# Altium footprint library Connector_PinHeader_2.54mm.PcbLib: 278 footprints (part 5 of 18) (continued)
## PinHeader_1x19_P2.54mm_Horizontal [mm] (continued)
  text "'.Designator'" at 3.61,-26.907 h1

## PinHeader_1x19_P2.54mm_Vertical [mm]
pads (19):
  rect 1.7x1.7 hole 1: 1(0,0)
  rrect100% 1.7x1.7 hole 1: 2(0,-2.54) 3(0,-5.08) 4(0,-7.62) 5(0,-10.16) 6(0,-12.7) 7(0,-15.24) 8(0,-17.78) 9(0,-20.32) 10(0,-22.86) 11(0,-25.4) 12(0,-27.94) 13(0,-30.48) 14(0,-33.02) 15(0,-35.56) 16(0,-38.1) 17(0,-40.64) 18(0,-43.18) 19(0,-45.72)
F.SilkS:
  lines w0.12: -1.33,0 -1.33,1.33 0,1.33 ; -1.33,-47.05 -1.33,-1.27 1.33,-1.27 1.33,-47.05 -1.33,-47.05
F.CrtYd:
  lines w0.05: -1.8,-47.5 1.8,-47.5 1.8,1.8 -1.8,1.8 -1.8,-47.5
F.Fab:
  lines w0.1: -1.27,-46.99 1.27,-46.99 1.27,1.27 -0.635,1.27 -1.27,0.635 -1.27,-46.99
  text "'.Designator'" at 0.84,-26.907 h1

## PinHeader_1x19_P2.54mm_Vertical_SMD_Pin1Left [mm]
pads (19):
  rect 2.51x1 smd: 1(-1.655,22.86) 2(1.655,20.32) 3(-1.655,17.78) 4(1.655,15.24) 5(-1.655,12.7) 6(1.655,10.16) 7(-1.655,7.62) 8(1.655,5.08) 9(-1.655,2.54) 10(1.655,0) 11(-1.655,-2.54) 12(1.655,-5.08) 13(-1.655,-7.62) 14(1.655,-10.16) 15(-1.655,-12.7) 16(1.655,-15.24) 17(-1.655,-17.78) 18(1.655,-20.32) 19(-1.655,-22.86)
F.SilkS:
  lines w0.12: -2.85,23.62 -1.33,23.62 -1.33,24.19 1.33,24.19 1.33,21.08 ; -1.33,-24.19 1.33,-24.19 ; -1.33,-22.1 -1.33,-18.54 ; -1.33,-17.02 -1.33,-13.46 ; -1.33,-11.94 -1.33,-8.38 ; -1.33,-6.86 -1.33,-3.3 ; -1.33,-1.78 -1.33,1.78 ; -1.33,3.3 -1.33,6.86 ; -1.33,8.38 -1.33,11.94 ; -1.33,13.46 -1.33,17.02 ; -1.33,18.54 -1.33,22.1 ; 1.33,-23.62 1.33,-24.19 ; 1.33,-21.08 1.33,-24.19 ; 1.33,-19.56 1.33,-16 ; 1.33,-14.48 1.33,-10.92 ; 1.33,-9.4 1.33,-5.84 ; 1.33,-4.32 1.33,-0.76 ; 1.33,0.76 1.33,4.32 ; 1.33,5.84 1.33,9.4 ; 1.33,10.92 1.33,14.48 ; 1.33,16 1.33,19.56
F.CrtYd:
  lines w0.05: -3.45,-24.65 -3.45,24.65 3.45,24.65 3.45,-24.65 -3.45,-24.65
F.Fab:
  lines w0.1: -1.27,-23.18 -2.54,-23.18 -2.54,-22.54 -1.27,-22.54 ; -1.27,-18.1 -2.54,-18.1 -2.54,-17.46 -1.27,-17.46 ; -1.27,-13.02 -2.54,-13.02 -2.54,-12.38 -1.27,-12.38 ; -1.27,-7.94 -2.54,-7.94 -2.54,-7.3 -1.27,-7.3 ; -1.27,-2.86 -2.54,-2.86 -2.54,-2.22 -1.27,-2.22 ; -1.27,2.22 -2.54,2.22 -2.54,2.86 -1.27,2.86 ; -1.27,7.3 -2.54,7.3 -2.54,7.94 -1.27,7.94 ; -1.27,12.38 -2.54,12.38 -2.54,13.02 -1.27,13.02 ; -1.27,17.46 -2.54,17.46 -2.54,18.1 -1.27,18.1 ; -1.27,22.54 -2.54,22.54 -2.54,23.18 -1.27,23.18 ; 1.27,-20.64 2.54,-20.64 2.54,-20 1.27,-20 ; 1.27,-15.56 2.54,-15.56 2.54,-14.92 1.27,-14.92 ; 1.27,-10.48 2.54,-10.48 2.54,-9.84 1.27,-9.84 ; 1.27,-5.4 2.54,-5.4 2.54,-4.76 1.27,-4.76 ; 1.27,-0.32 2.54,-0.32 2.54,0.32 1.27,0.32 ; 1.27,4.76 2.54,4.76 2.54,5.4 1.27,5.4 ; 1.27,9.84 2.54,9.84 2.54,10.48 1.27,10.48 ; 1.27,14.92 2.54,14.92 2.54,15.56 1.27,15.56 ; 1.27,20 2.54,20 2.54,20.64 1.27,20.64 ; -1.27,23.18 -0.32,24.13 1.27,24.13 1.27,-24.13 -1.27,-24.13 -1.27,23.18
  text "'.Designator'" at 0.84,-4.047 h1

## PinHeader_1x19_P2.54mm_Vertical_SMD_Pin1Right [mm]
pads (19):
  rect 2.51x1 smd: 1(1.655,22.86) 2(-1.655,20.32) 3(1.655,17.78) 4(-1.655,15.24) 5(1.655,12.7) 6(-1.655,10.16) 7(1.655,7.62) 8(-1.655,5.08) 9(1.655,2.54) 10(-1.655,0) 11(1.655,-2.54) 12(-1.655,-5.08) 13(1.655,-7.62) 14(-1.655,-10.16) 15(1.655,-12.7) 16(-1.655,-15.24) 17(1.655,-17.78) 18(-1.655,-20.32) 19(1.655,-22.86)
F.SilkS:
  lines w0.12: -1.33,-23.62 -1.33,-24.19 ; -1.33,-21.08 -1.33,-24.19 ; -1.33,-19.56 -1.33,-16 ; -1.33,-14.48 -1.33,-10.92 ; -1.33,-9.4 -1.33,-5.84 ; -1.33,-4.32 -1.33,-0.76 ; -1.33,0.76 -1.33,4.32 ; -1.33,5.84 -1.33,9.4 ; -1.33,10.92 -1.33,14.48 ; -1.33,16 -1.33,19.56 ; -1.33,21.08 -1.33,24.19 1.33,24.19 1.33,23.62 2.85,23.62 ; 1.33,-24.19 -1.33,-24.19 ; 1.33,-22.1 1.33,-18.54 ; 1.33,-17.02 1.33,-13.46 ; 1.33,-11.94 1.33,-8.38 ; 1.33,-6.86 1.33,-3.3 ; 1.33,-1.78 1.33,1.78 ; 1.33,3.3 1.33,6.86 ; 1.33,8.38 1.33,11.94 ; 1.33,13.46 1.33,17.02 ; 1.33,18.54 1.33,22.1
F.CrtYd:
  lines w0.05: -3.45,-24.65 3.45,-24.65 3.45,24.65 -3.45,24.65 -3.45,-24.65
F.Fab:
  lines w0.1: -1.27,-20.64 -2.54,-20.64 -2.54,-20 -1.27,-20 ; -1.27,-15.56 -2.54,-15.56 -2.54,-14.92 -1.27,-14.92 ; -1.27,-10.48 -2.54,-10.48 -2.54,-9.84 -1.27,-9.84 ; -1.27,-5.4 -2.54,-5.4 -2.54,-4.76 -1.27,-4.76 ; -1.27,-0.32 -2.54,-0.32 -2.54,0.32 -1.27,0.32 ; -1.27,4.76 -2.54,4.76 -2.54,5.4 -1.27,5.4 ; -1.27,9.84 -2.54,9.84 -2.54,10.48 -1.27,10.48 ; -1.27,14.92 -2.54,14.92 -2.54,15.56 -1.27,15.56 ; -1.27,20 -2.54,20 -2.54,20.64 -1.27,20.64 ; 1.27,-23.18 2.54,-23.18 2.54,-22.54 1.27,-22.54 ; 1.27,-18.1 2.54,-18.1 2.54,-17.46 1.27,-17.46 ; 1.27,-13.02 2.54,-13.02 2.54,-12.38 1.27,-12.38 ; 1.27,-7.94 2.54,-7.94 2.54,-7.3 1.27,-7.3 ; 1.27,-2.86 2.54,-2.86 2.54,-2.22 1.27,-2.22 ; 1.27,2.22 2.54,2.22 2.54,2.86 1.27,2.86 ; 1.27,7.3 2.54,7.3 2.54,7.94 1.27,7.94 ; 1.27,12.38 2.54,12.38 2.54,13.02 1.27,13.02 ; 1.27,17.46 2.54,17.46 2.54,18.1 1.27,18.1 ; 1.27,22.54 2.54,22.54 2.54,23.18 1.27,23.18 ; 1.27,23.18 0.32,24.13 -1.27,24.13 -1.27,-24.13 1.27,-24.13 1.27,23.18
  text "'.Designator'" at 0.84,-4.047 h1

## PinHeader_1x20_P2.54mm_Horizontal [mm]
pads (20):
  rect 1.7x1.7 hole 1: 1(0,0)
  rrect100% 1.7x1.7 hole 1: 2(0,-2.54) 3(0,-5.08) 4(0,-7.62) 5(0,-10.16) 6(0,-12.7) 7(0,-15.24) 8(0,-17.78) 9(0,-20.32) 10(0,-22.86) 11(0,-25.4) 12(0,-27.94) 13(0,-30.48) 14(0,-33.02) 15(0,-35.56) 16(0,-38.1) 17(0,-40.64) 18(0,-43.18) 19(0,-45.72) 20(0,-48.26)
F.SilkS:
  lines w0.12: -1.27,0 -1.27,1.27 0,1.27 ; 1.043,-48.64 1.44,-48.64 ; 1.043,-47.88 1.44,-47.88 ; 1.043,-46.1 1.44,-46.1 ; 1.043,-45.34 1.44,-45.34 ; 1.043,-43.56 1.44,-43.56 ; 1.043,-42.8 1.44,-42.8 ; 1.043,-41.02 1.44,-41.02 ; 1.043,-40.26 1.44,-40.26 ; 1.043,-38.48 1.44,-38.48 ; 1.043,-37.72 1.44,-37.72 ; 1.043,-35.94 1.44,-35.94 ; 1.043,-35.18 1.44,-35.18 ; 1.043,-33.4 1.44,-33.4 ; 1.043,-32.64 1.44,-32.64 ; 1.043,-30.86 1.44,-30.86 ; 1.043,-30.1 1.44,-30.1 ; 1.043,-28.32 1.44,-28.32 ; 1.043,-27.56 1.44,-27.56 ; 1.043,-25.78 1.44,-25.78 ; 1.043,-25.02 1.44,-25.02 ; 1.043,-23.24 1.44,-23.24 ; 1.043,-22.48 1.44,-22.48 ; 1.043,-20.7 1.44,-20.7 ; 1.043,-19.94 1.44,-19.94 ; 1.043,-18.16 1.44,-18.16 ; 1.043,-17.4 1.44,-17.4 ; 1.043,-15.62 1.44,-15.62 ; 1.043,-14.86 1.44,-14.86 ; 1.043,-13.08 1.44,-13.08 ; 1.043,-12.32 1.44,-12.32 ; 1.043,-10.54 1.44,-10.54 ; 1.043,-9.78 1.44,-9.78 ; 1.043,-8 1.44,-8 ; 1.043,-7.24 1.44,-7.24 ; 1.043,-5.46 1.44,-5.46 ; 1.043,-4.7 1.44,-4.7 ; 1.043,-2.92 1.44,-2.92 ; 1.043,-2.16 1.44,-2.16 ; 1.11,-0.38 1.44,-0.38 ; 1.11,0.38 1.44,0.38 ; 1.44,-46.99 4.1,-46.99 ; 1.44,-44.45 4.1,-44.45 ; 1.44,-41.91 4.1,-41.91 ; 1.44,-39.37 4.1,-39.37 ; 1.44,-36.83 4.1,-36.83 ; 1.44,-34.29 4.1,-34.29 ; 1.44,-31.75 4.1,-31.75 ; 1.44,-29.21 4.1,-29.21 ; 1.44,-26.67 4.1,-26.67 ; 1.44,-24.13 4.1,-24.13 ; 1.44,-21.59 4.1,-21.59 ; 1.44,-19.05 4.1,-19.05 ; 1.44,-16.51 4.1,-16.51 ; 1.44,-13.97 4.1,-13.97 ; 1.44,-11.43 4.1,-11.43 ; 1.44,-8.89 4.1,-8.89 ; 1.44,-6.35 4.1,-6.35 ; 1.44,-3.81 4.1,-3.81 ; 1.44,-1.27 4.1,-1.27 ; 4.1,-48.64 10.1,-48.64 10.1,-47.88 4.1,-47.88 ; 4.1,-46.1 10.1,-46.1 10.1,-45.34 4.1,-45.34 ; 4.1,-43.56 10.1,-43.56 10.1,-42.8 4.1,-42.8 ; 4.1,-41.02 10.1,-41.02 10.1,-40.26 4.1,-40.26 ; 4.1,-38.48 10.1,-38.48 10.1,-37.72 4.1,-37.72 ; 4.1,-35.94 10.1,-35.94 10.1,-35.18 4.1,-35.18 ; 4.1,-33.4 10.1,-33.4 10.1,-32.64 4.1,-32.64 ; 4.1,-30.86 10.1,-30.86 10.1,-30.1 4.1,-30.1 ; 4.1,-28.32 10.1,-28.32 10.1,-27.56 4.1,-27.56 ; 4.1,-25.78 10.1,-25.78 10.1,-25.02 4.1,-25.02 ; 4.1,-23.24 10.1,-23.24 10.1,-22.48 4.1,-22.48 ; 4.1,-20.7 10.1,-20.7 10.1,-19.94 4.1,-19.94 ; 4.1,-18.16 10.1,-18.16 10.1,-17.4 4.1,-17.4 ; 4.1,-15.62 10.1,-15.62 10.1,-14.86 4.1,-14.86 ; 4.1,-13.08 10.1,-13.08 10.1,-12.32 4.1,-12.32 ; 4.1,-10.54 10.1,-10.54 10.1,-9.78 4.1,-9.78 ; 4.1,-8 10.1,-8 10.1,-7.24 4.1,-7.24 ; 4.1,-5.46 10.1,-5.46 10.1,-4.7 4.1,-4.7 ; 4.1,-2.92 10.1,-2.92 10.1,-2.16 4.1,-2.16 ; 4.1,-0.38 10.1,-0.38 10.1,0.38 4.1,0.38 ; 4.1,-0.28 10.1,-0.28 ; 4.1,-0.16 10.1,-0.16 ; 4.1,-0.04 10.1,-0.04 ; 4.1,0.08 10.1,0.08 ; 4.1,0.2 10.1,0.2 ; 4.1,0.32 10.1,0.32 ; 1.44,-49.59 4.1,-49.59 4.1,1.33 1.44,1.33 1.44,-49.59
F.CrtYd:
  lines w0.05: -1.8,-50.05 10.55,-50.05 10.55,1.8 -1.8,1.8 -1.8,-50.05
F.Fab:
  lines w0.1: 1.5,-48.58 -0.32,-48.58 -0.32,-47.94 1.5,-47.94 ; 1.5,-46.04 -0.32,-46.04 -0.32,-45.4 1.5,-45.4 ; 1.5,-43.5 -0.32,-43.5 -0.32,-42.86 1.5,-42.86 ; 1.5,-40.96 -0.32,-40.96 -0.32,-40.32 1.5,-40.32 ; 1.5,-38.42 -0.32,-38.42 -0.32,-37.78 1.5,-37.78 ; 1.5,-35.88 -0.32,-35.88 -0.32,-35.24 1.5,-35.24 ; 1.5,-33.34 -0.32,-33.34 -0.32,-32.7 1.5,-32.7 ; 1.5,-30.8 -0.32,-30.8 -0.32,-30.16 1.5,-30.16 ; 1.5,-28.26 -0.32,-28.26 -0.32,-27.62 1.5,-27.62 ; 1.5,-25.72 -0.32,-25.72 -0.32,-25.08 1.5,-25.08 ; 1.5,-23.18 -0.32,-23.18 -0.32,-22.54 1.5,-22.54 ; 1.5,-20.64 -0.32,-20.64 -0.32,-20 1.5,-20 ; 1.5,-18.1 -0.32,-18.1 -0.32,-17.46 1.5,-17.46 ; 1.5,-15.56 -0.32,-15.56 -0.32,-14.92 1.5,-14.92 ; 1.5,-13.02 -0.32,-13.02 -0.32,-12.38 1.5,-12.38 ; 1.5,-10.48 -0.32,-10.48 -0.32,-9.84 1.5,-9.84 ; 1.5,-7.94 -0.32,-7.94 -0.32,-7.3 1.5,-7.3 ; 1.5,-5.4 -0.32,-5.4 -0.32,-4.76 1.5,-4.76 ; 1.5,-2.86 -0.32,-2.86 -0.32,-2.22 1.5,-2.22 ; 1.5,-0.32 -0.32,-0.32 -0.32,0.32 1.5,0.32 ; 4.04,-48.58 10.04,-48.58 10.04,-47.94 4.04,-47.94 ; 4.04,-46.04 10.04,-46.04 10.04,-45.4 4.04,-45.4 ; 4.04,-43.5 10.04,-43.5 10.04,-42.86 4.04,-42.86 ; 4.04,-40.96 10.04,-40.96 10.04,-40.32 4.04,-40.32 ; 4.04,-38.42 10.04,-38.42 10.04,-37.78 4.04,-37.78 ; 4.04,-35.88 10.04,-35.88 10.04,-35.24 4.04,-35.24 ; 4.04,-33.34 10.04,-33.34 10.04,-32.7 4.04,-32.7 ; 4.04,-30.8 10.04,-30.8 10.04,-30.16 4.04,-30.16 ; 4.04,-28.26 10.04,-28.26 10.04,-27.62 4.04,-27.62 ; 4.04,-25.72 10.04,-25.72 10.04,-25.08 4.04,-25.08 ; 4.04,-23.18 10.04,-23.18 10.04,-22.54 4.04,-22.54 ; 4.04,-20.64 10.04,-20.64 10.04,-20 4.04,-20 ; 4.04,-18.1 10.04,-18.1 10.04,-17.46 4.04,-17.46 ; 4.04,-15.56 10.04,-15.56 10.04,-14.92 4.04,-14.92 ; 4.04,-13.02 10.04,-13.02 10.04,-12.38 4.04,-12.38 ; 4.04,-10.48 10.04,-10.48 10.04,-9.84 4.04,-9.84 ; 4.04,-7.94 10.04,-7.94 10.04,-7.3 4.04,-7.3 ; 4.04,-5.4 10.04,-5.4 10.04,-4.76 4.04,-4.76 ; 4.04,-2.86 10.04,-2.86 10.04,-2.22 4.04,-2.22 ; 4.04,-0.32 10.04,-0.32 10.04,0.32 4.04,0.32 ; 1.5,-49.53 4.04,-49.53 4.04,1.27 2.135,1.27 1.5,0.635 1.5,-49.53
  text "'.Designator'" at 3.61,-28.177 h1

## PinHeader_1x20_P2.54mm_Vertical [mm]
pads (20):
  rect 1.7x1.7 hole 1: 1(0,0)
  rrect100% 1.7x1.7 hole 1: 2(0,-2.54) 3(0,-5.08) 4(0,-7.62) 5(0,-10.16) 6(0,-12.7) 7(0,-15.24) 8(0,-17.78) 9(0,-20.32) 10(0,-22.86) 11(0,-25.4) 12(0,-27.94) 13(0,-30.48) 14(0,-33.02) 15(0,-35.56) 16(0,-38.1) 17(0,-40.64) 18(0,-43.18) 19(0,-45.72) 20(0,-48.26)
F.SilkS:
  lines w0.12: -1.33,0 -1.33,1.33 0,1.33 ; -1.33,-49.59 1.33,-49.59 1.33,-1.27 -1.33,-1.27 -1.33,-49.59
F.CrtYd:
  lines w0.05: -1.8,-50.05 1.8,-50.05 1.8,1.8 -1.8,1.8 -1.8,-50.05
F.Fab:
  lines w0.1: -1.27,-49.53 -1.27,0.635 -0.635,1.27 1.27,1.27 1.27,-49.53 -1.27,-49.53
  text "'.Designator'" at 0.84,-28.177 h1

## PinHeader_1x20_P2.54mm_Vertical_SMD_Pin1Left [mm]
pads (20):
  rect 2.51x1 smd: 1(-1.655,24.13) 2(1.655,21.59) 3(-1.655,19.05) 4(1.655,16.51) 5(-1.655,13.97) 6(1.655,11.43) 7(-1.655,8.89) 8(1.655,6.35) 9(-1.655,3.81) 10(1.655,1.27) 11(-1.655,-1.27) 12(1.655,-3.81) 13(-1.655,-6.35) 14(1.655,-8.89) 15(-1.655,-11.43) 16(1.655,-13.97) 17(-1.655,-16.51) 18(1.655,-19.05) 19(-1.655,-21.59) 20(1.655,-24.13)
F.SilkS:
  lines w0.12: -2.85,24.89 -1.33,24.89 -1.33,25.46 1.33,25.46 1.33,22.35 ; -1.33,-22.35 -1.33,-25.46 1.33,-25.46 1.33,-24.89 ; -1.33,-20.83 -1.33,-17.27 ; -1.33,-15.75 -1.33,-12.19 ; -1.33,-10.67 -1.33,-7.11 ; -1.33,-5.59 -1.33,-2.03 ; -1.33,-0.51 -1.33,3.05 ; -1.33,4.57 -1.33,8.13 ; -1.33,9.65 -1.33,13.21 ; -1.33,14.73 -1.33,18.29 ; -1.33,19.81 -1.33,23.37 ; 1.33,-23.37 1.33,-19.81 ; 1.33,-18.29 1.33,-14.73 ; 1.33,-13.21 1.33,-9.65 ; 1.33,-8.13 1.33,-4.57 ; 1.33,-3.05 1.33,0.51 ; 1.33,2.03 1.33,5.59 ; 1.33,7.11 1.33,10.67 ; 1.33,12.19 1.33,15.75 ; 1.33,17.27 1.33,20.83
F.CrtYd:
  lines w0.05: -3.45,-25.9 3.45,-25.9 3.45,25.9 -3.45,25.9 -3.45,-25.9
F.Fab:
  lines w0.1: -1.27,-21.91 -2.54,-21.91 -2.54,-21.27 -1.27,-21.27 ; -1.27,-16.83 -2.54,-16.83 -2.54,-16.19 -1.27,-16.19 ; -1.27,-11.75 -2.54,-11.75 -2.54,-11.11 -1.27,-11.11 ; -1.27,-6.67 -2.54,-6.67 -2.54,-6.03 -1.27,-6.03 ; -1.27,-1.59 -2.54,-1.59 -2.54,-0.95 -1.27,-0.95 ; -1.27,3.49 -2.54,3.49 -2.54,4.13 -1.27,4.13 ; -1.27,8.57 -2.54,8.57 -2.54,9.21 -1.27,9.21 ; -1.27,13.65 -2.54,13.65 -2.54,14.29 -1.27,14.29 ; -1.27,18.73 -2.54,18.73 -2.54,19.37 -1.27,19.37 ; -1.27,23.81 -2.54,23.81 -2.54,24.45 -1.27,24.45 ; 1.27,-24.45 2.54,-24.45 2.54,-23.81 1.27,-23.81 ; 1.27,-19.37 2.54,-19.37 2.54,-18.73 1.27,-18.73 ; 1.27,-14.29 2.54,-14.29 2.54,-13.65 1.27,-13.65 ; 1.27,-9.21 2.54,-9.21 2.54,-8.57 1.27,-8.57 ; 1.27,-4.13 2.54,-4.13 2.54,-3.49 1.27,-3.49 ; 1.27,0.95 2.54,0.95 2.54,1.59 1.27,1.59 ; 1.27,6.03 2.54,6.03 2.54,6.67 1.27,6.67 ; 1.27,11.11 2.54,11.11 2.54,11.75 1.27,11.75 ; 1.27,16.19 2.54,16.19 2.54,16.83 1.27,16.83 ; 1.27,21.27 2.54,21.27 2.54,21.91 1.27,21.91 ; -1.27,24.45 -0.32,25.4 1.27,25.4 1.27,-25.4 -1.27,-25.4 -1.27,24.45
  text "'.Designator'" at 0.84,-4.047 h1

## PinHeader_1x20_P2.54mm_Vertical_SMD_Pin1Right [mm]
pads (20):
  rect 2.51x1 smd: 1(1.655,24.13) 2(-1.655,21.59) 3(1.655,19.05) 4(-1.655,16.51) 5(1.655,13.97) 6(-1.655,11.43) 7(1.655,8.89) 8(-1.655,6.35) 9(1.655,3.81) 10(-1.655,1.27) 11(1.655,-1.27) 12(-1.655,-3.81) 13(1.655,-6.35) 14(-1.655,-8.89) 15(1.655,-11.43) 16(-1.655,-13.97) 17(1.655,-16.51) 18(-1.655,-19.05) 19(1.655,-21.59) 20(-1.655,-24.13)
F.SilkS:
  lines w0.12: -1.33,-24.89 -1.33,-25.46 1.33,-25.46 1.33,-22.35 ; -1.33,-23.37 -1.33,-19.81 ; -1.33,-18.29 -1.33,-14.73 ; -1.33,-13.21 -1.33,-9.65 ; -1.33,-8.13 -1.33,-4.57 ; -1.33,-3.05 -1.33,0.51 ; -1.33,2.03 -1.33,5.59 ; -1.33,7.11 -1.33,10.67 ; -1.33,12.19 -1.33,15.75 ; -1.33,17.27 -1.33,20.83 ; -1.33,22.35 -1.33,25.46 1.33,25.46 1.33,24.89 2.85,24.89 ; 1.33,-20.83 1.33,-17.27 ; 1.33,-15.75 1.33,-12.19 ; 1.33,-10.67 1.33,-7.11 ; 1.33,-5.59 1.33,-2.03 ; 1.33,-0.51 1.33,3.05 ; 1.33,4.57 1.33,8.13 ; 1.33,9.65 1.33,13.21 ; 1.33,14.73 1.33,18.29 ; 1.33,19.81 1.33,23.37
F.CrtYd:
  lines w0.05: -3.45,-25.9 3.45,-25.9 3.45,25.9 -3.45,25.9 -3.45,-25.9
F.Fab:
  lines w0.1: -1.27,-24.45 -2.54,-24.45 -2.54,-23.81 -1.27,-23.81 ; -1.27,-19.37 -2.54,-19.37 -2.54,-18.73 -1.27,-18.73 ; -1.27,-14.29 -2.54,-14.29 -2.54,-13.65 -1.27,-13.65 ; -1.27,-9.21 -2.54,-9.21 -2.54,-8.57 -1.27,-8.57 ; -1.27,-4.13 -2.54,-4.13 -2.54,-3.49 -1.27,-3.49 ; -1.27,0.95 -2.54,0.95 -2.54,1.59 -1.27,1.59 ; -1.27,6.03 -2.54,6.03 -2.54,6.67 -1.27,6.67 ; -1.27,11.11 -2.54,11.11 -2.54,11.75 -1.27,11.75 ; -1.27,16.19 -2.54,16.19 -2.54,16.83 -1.27,16.83 ; -1.27,21.27 -2.54,21.27 -2.54,21.91 -1.27,21.91 ; 1.27,-21.91 2.54,-21.91 2.54,-21.27 1.27,-21.27 ; 1.27,-16.83 2.54,-16.83 2.54,-16.19 1.27,-16.19 ; 1.27,-11.75 2.54,-11.75 2.54,-11.11 1.27,-11.11 ; 1.27,-6.67 2.54,-6.67 2.54,-6.03 1.27,-6.03 ; 1.27,-1.59 2.54,-1.59 2.54,-0.95 1.27,-0.95 ; 1.27,3.49 2.54,3.49 2.54,4.13 1.27,4.13 ; 1.27,8.57 2.54,8.57 2.54,9.21 1.27,9.21 ; 1.27,13.65 2.54,13.65 2.54,14.29 1.27,14.29 ; 1.27,18.73 2.54,18.73 2.54,19.37 1.27,19.37 ; 1.27,23.81 2.54,23.81 2.54,24.45 1.27,24.45 ; 1.27,24.45 0.32,25.4 -1.27,25.4 -1.27,-25.4 1.27,-25.4 1.27,24.45
  text "'.Designator'" at 0.84,-4.047 h1

## PinHeader_1x21_P2.54mm_Horizontal [mm]
pads (21):
  rect 1.7x1.7 hole 1: 1(0,0)
  rrect100% 1.7x1.7 hole 1: 2(0,-2.54) 3(0,-5.08) 4(0,-7.62) 5(0,-10.16) 6(0,-12.7) 7(0,-15.24) 8(0,-17.78) 9(0,-20.32) 10(0,-22.86) 11(0,-25.4) 12(0,-27.94) 13(0,-30.48) 14(0,-33.02) 15(0,-35.56) 16(0,-38.1) 17(0,-40.64) 18(0,-43.18) 19(0,-45.72) 20(0,-48.26) 21(0,-50.8)
F.SilkS:
  lines w0.12: -1.27,0 -1.27,1.27 0,1.27 ; 1.043,-51.18 1.44,-51.18 ; 1.043,-50.42 1.44,-50.42 ; 1.043,-48.64 1.44,-48.64 ; 1.043,-47.88 1.44,-47.88 ; 1.043,-46.1 1.44,-46.1 ; 1.043,-45.34 1.44,-45.34 ; 1.043,-43.56 1.44,-43.56 ; 1.043,-42.8 1.44,-42.8 ; 1.043,-41.02 1.44,-41.02 ; 1.043,-40.26 1.44,-40.26 ; 1.043,-38.48 1.44,-38.48 ; 1.043,-37.72 1.44,-37.72 ; 1.043,-35.94 1.44,-35.94 ; 1.043,-35.18 1.44,-35.18 ; 1.043,-33.4 1.44,-33.4 ; 1.043,-32.64 1.44,-32.64 ; 1.043,-30.86 1.44,-30.86 ; 1.043,-30.1 1.44,-30.1 ; 1.043,-28.32 1.44,-28.32 ; 1.043,-27.56 1.44,-27.56 ; 1.043,-25.78 1.44,-25.78 ; 1.043,-25.02 1.44,-25.02 ; 1.043,-23.24 1.44,-23.24 ; 1.043,-22.48 1.44,-22.48 ; 1.043,-20.7 1.44,-20.7 ; 1.043,-19.94 1.44,-19.94 ; 1.043,-18.16 1.44,-18.16 ; 1.043,-17.4 1.44,-17.4 ; 1.043,-15.62 1.44,-15.62 ; 1.043,-14.86 1.44,-14.86 ; 1.043,-13.08 1.44,-13.08 ; 1.043,-12.32 1.44,-12.32 ; 1.043,-10.54 1.44,-10.54 ; 1.043,-9.78 1.44,-9.78 ; 1.043,-8 1.44,-8 ; 1.043,-7.24 1.44,-7.24 ; 1.043,-5.46 1.44,-5.46 ; 1.043,-4.7 1.44,-4.7 ; 1.043,-2.92 1.44,-2.92 ; 1.043,-2.16 1.44,-2.16 ; 1.11,-0.38 1.44,-0.38 ; 1.11,0.38 1.44,0.38 ; 1.44,-49.53 4.1,-49.53 ; 1.44,-46.99 4.1,-46.99 ; 1.44,-44.45 4.1,-44.45 ; 1.44,-41.91 4.1,-41.91 ; 1.44,-39.37 4.1,-39.37 ; 1.44,-36.83 4.1,-36.83 ; 1.44,-34.29 4.1,-34.29 ; 1.44,-31.75 4.1,-31.75 ; 1.44,-29.21 4.1,-29.21 ; 1.44,-26.67 4.1,-26.67 ; 1.44,-24.13 4.1,-24.13 ; 1.44,-21.59 4.1,-21.59 ; 1.44,-19.05 4.1,-19.05 ; 1.44,-16.51 4.1,-16.51 ; 1.44,-13.97 4.1,-13.97 ; 1.44,-11.43 4.1,-11.43 ; 1.44,-8.89 4.1,-8.89 ; 1.44,-6.35 4.1,-6.35 ; 1.44,-3.81 4.1,-3.81 ; 1.44,-1.27 4.1,-1.27 ; 4.1,-51.18 10.1,-51.18 10.1,-50.42 4.1,-50.42 ; 4.1,-48.64 10.1,-48.64 10.1,-47.88 4.1,-47.88 ; 4.1,-46.1 10.1,-46.1 10.1,-45.34 4.1,-45.34 ; 4.1,-43.56 10.1,-43.56 10.1,-42.8 4.1,-42.8 ; 4.1,-41.02 10.1,-41.02 10.1,-40.26 4.1,-40.26 ; 4.1,-38.48 10.1,-38.48 10.1,-37.72 4.1,-37.72 ; 4.1,-35.94 10.1,-35.94 10.1,-35.18 4.1,-35.18 ; 4.1,-33.4 10.1,-33.4 10.1,-32.64 4.1,-32.64 ; 4.1,-30.86 10.1,-30.86 10.1,-30.1 4.1,-30.1 ; 4.1,-28.32 10.1,-28.32 10.1,-27.56 4.1,-27.56 ; 4.1,-25.78 10.1,-25.78 10.1,-25.02 4.1,-25.02 ; 4.1,-23.24 10.1,-23.24 10.1,-22.48 4.1,-22.48 ; 4.1,-20.7 10.1,-20.7 10.1,-19.94 4.1,-19.94 ; 4.1,-18.16 10.1,-18.16 10.1,-17.4 4.1,-17.4 ; 4.1,-15.62 10.1,-15.62 10.1,-14.86 4.1,-14.86 ; 4.1,-13.08 10.1,-13.08 10.1,-12.32 4.1,-12.32 ; 4.1,-10.54 10.1,-10.54 10.1,-9.78 4.1,-9.78 ; 4.1,-8 10.1,-8 10.1,-7.24 4.1,-7.24 ; 4.1,-5.46 10.1,-5.46 10.1,-4.7 4.1,-4.7 ; 4.1,-2.92 10.1,-2.92 10.1,-2.16 4.1,-2.16 ; 4.1,-0.38 10.1,-0.38 10.1,0.38 4.1,0.38 ; 4.1,-0.28 10.1,-0.28 ; 4.1,-0.16 10.1,-0.16 ; 4.1,-0.04 10.1,-0.04 ; 4.1,0.08 10.1,0.08 ; 4.1,0.2 10.1,0.2 ; 4.1,0.32 10.1,0.32 ; 1.44,-52.13 1.44,1.33 4.1,1.33 4.1,-52.13 1.44,-52.13
F.CrtYd:
  lines w0.05: -1.8,-52.6 -1.8,1.8 10.55,1.8 10.55,-52.6 -1.8,-52.6
F.Fab:
  lines w0.1: 1.5,-51.12 -0.32,-51.12 -0.32,-50.48 1.5,-50.48 ; 1.5,-48.58 -0.32,-48.58 -0.32,-47.94 1.5,-47.94 ; 1.5,-46.04 -0.32,-46.04 -0.32,-45.4 1.5,-45.4 ; 1.5,-43.5 -0.32,-43.5 -0.32,-42.86 1.5,-42.86 ; 1.5,-40.96 -0.32,-40.96 -0.32,-40.32 1.5,-40.32 ; 1.5,-38.42 -0.32,-38.42 -0.32,-37.78 1.5,-37.78 ; 1.5,-35.88 -0.32,-35.88 -0.32,-35.24 1.5,-35.24 ; 1.5,-33.34 -0.32,-33.34 -0.32,-32.7 1.5,-32.7 ; 1.5,-30.8 -0.32,-30.8 -0.32,-30.16 1.5,-30.16 ; 1.5,-28.26 -0.32,-28.26 -0.32,-27.62 1.5,-27.62 ; 1.5,-25.72 -0.32,-25.72 -0.32,-25.08 1.5,-25.08 ; 1.5,-23.18 -0.32,-23.18 -0.32,-22.54 1.5,-22.54 ; 1.5,-20.64 -0.32,-20.64 -0.32,-20 1.5,-20 ; 1.5,-18.1 -0.32,-18.1 -0.32,-17.46 1.5,-17.46 ; 1.5,-15.56 -0.32,-15.56 -0.32,-14.92 1.5,-14.92 ; 1.5,-13.02 -0.32,-13.02 -0.32,-12.38 1.5,-12.38 ; 1.5,-10.48 -0.32,-10.48 -0.32,-9.84 1.5,-9.84 ; 1.5,-7.94 -0.32,-7.94 -0.32,-7.3 1.5,-7.3 ; 1.5,-5.4 -0.32,-5.4 -0.32,-4.76 1.5,-4.76 ; 1.5,-2.86 -0.32,-2.86 -0.32,-2.22 1.5,-2.22 ; 1.5,-0.32 -0.32,-0.32 -0.32,0.32 1.5,0.32 ; 4.04,-51.12 10.04,-51.12 10.04,-50.48 4.04,-50.48 ; 4.04,-48.58 10.04,-48.58 10.04,-47.94 4.04,-47.94 ; 4.04,-46.04 10.04,-46.04 10.04,-45.4 4.04,-45.4 ; 4.04,-43.5 10.04,-43.5 10.04,-42.86 4.04,-42.86 ; 4.04,-40.96 10.04,-40.96 10.04,-40.32 4.04,-40.32 ; 4.04,-38.42 10.04,-38.42 10.04,-37.78 4.04,-37.78 ; 4.04,-35.88 10.04,-35.88 10.04,-35.24 4.04,-35.24 ; 4.04,-33.34 10.04,-33.34 10.04,-32.7 4.04,-32.7 ; 4.04,-30.8 10.04,-30.8 10.04,-30.16 4.04,-30.16 ; 4.04,-28.26 10.04,-28.26 10.04,-27.62 4.04,-27.62 ; 4.04,-25.72 10.04,-25.72 10.04,-25.08 4.04,-25.08 ; 4.04,-23.18 10.04,-23.18 10.04,-22.54 4.04,-22.54 ; 4.04,-20.64 10.04,-20.64 10.04,-20 4.04,-20 ; 4.04,-18.1 10.04,-18.1 10.04,-17.46 4.04,-17.46 ; 4.04,-15.56 10.04,-15.56 10.04,-14.92 4.04,-14.92 ; 4.04,-13.02 10.04,-13.02 10.04,-12.38 4.04,-12.38 ; 4.04,-10.48 10.04,-10.48 10.04,-9.84 4.04,-9.84 ; 4.04,-7.94 10.04,-7.94 10.04,-7.3 4.04,-7.3 ; 4.04,-5.4 10.04,-5.4 10.04,-4.76 4.04,-4.76 ; 4.04,-2.86 10.04,-2.86 10.04,-2.22 4.04,-2.22 ; 4.04,-0.32 10.04,-0.32 10.04,0.32 4.04,0.32 ; 1.5,-52.07 1.5,0.635 2.135,1.27 4.04,1.27 4.04,-52.07 1.5,-52.07
  text "'.Designator'" at 3.61,-29.447 h1

## PinHeader_1x21_P2.54mm_Vertical [mm]
pads (21):
  rect 1.7x1.7 hole 1: 1(0,0)
  rrect100% 1.7x1.7 hole 1: 2(0,-2.54) 3(0,-5.08) 4(0,-7.62) 5(0,-10.16) 6(0,-12.7) 7(0,-15.24) 8(0,-17.78) 9(0,-20.32) 10(0,-22.86) 11(0,-25.4) 12(0,-27.94) 13(0,-30.48) 14(0,-33.02) 15(0,-35.56) 16(0,-38.1) 17(0,-40.64) 18(0,-43.18) 19(0,-45.72) 20(0,-48.26) 21(0,-50.8)
F.SilkS:
  lines w0.12: -1.33,0 -1.33,1.33 0,1.33 ; -1.33,-52.13 1.33,-52.13 1.33,-1.27 -1.33,-1.27 -1.33,-52.13
F.CrtYd:
  lines w0.05: -1.8,-52.6 1.8,-52.6 1.8,1.8 -1.8,1.8 -1.8,-52.6
F.Fab:
  lines w0.1: -1.27,-52.07 -1.27,0.635 -0.635,1.27 1.27,1.27 1.27,-52.07 -1.27,-52.07
  text "'.Designator'" at 0.84,-29.447 h1